# Altium footprint library COOP4403_V2.PcbLib: 26 footprints (part 1 of 2)
Each footprint in its own frame and in the unit in brackets; x right, y up, seen from the top. Pads: shape width x height; smd on the part's side, far side on the other; paste and mask are expansions set on the pad; w line width, h text height; cw(c..) or ccw(c..) is an arc to the next point about the centre after c.
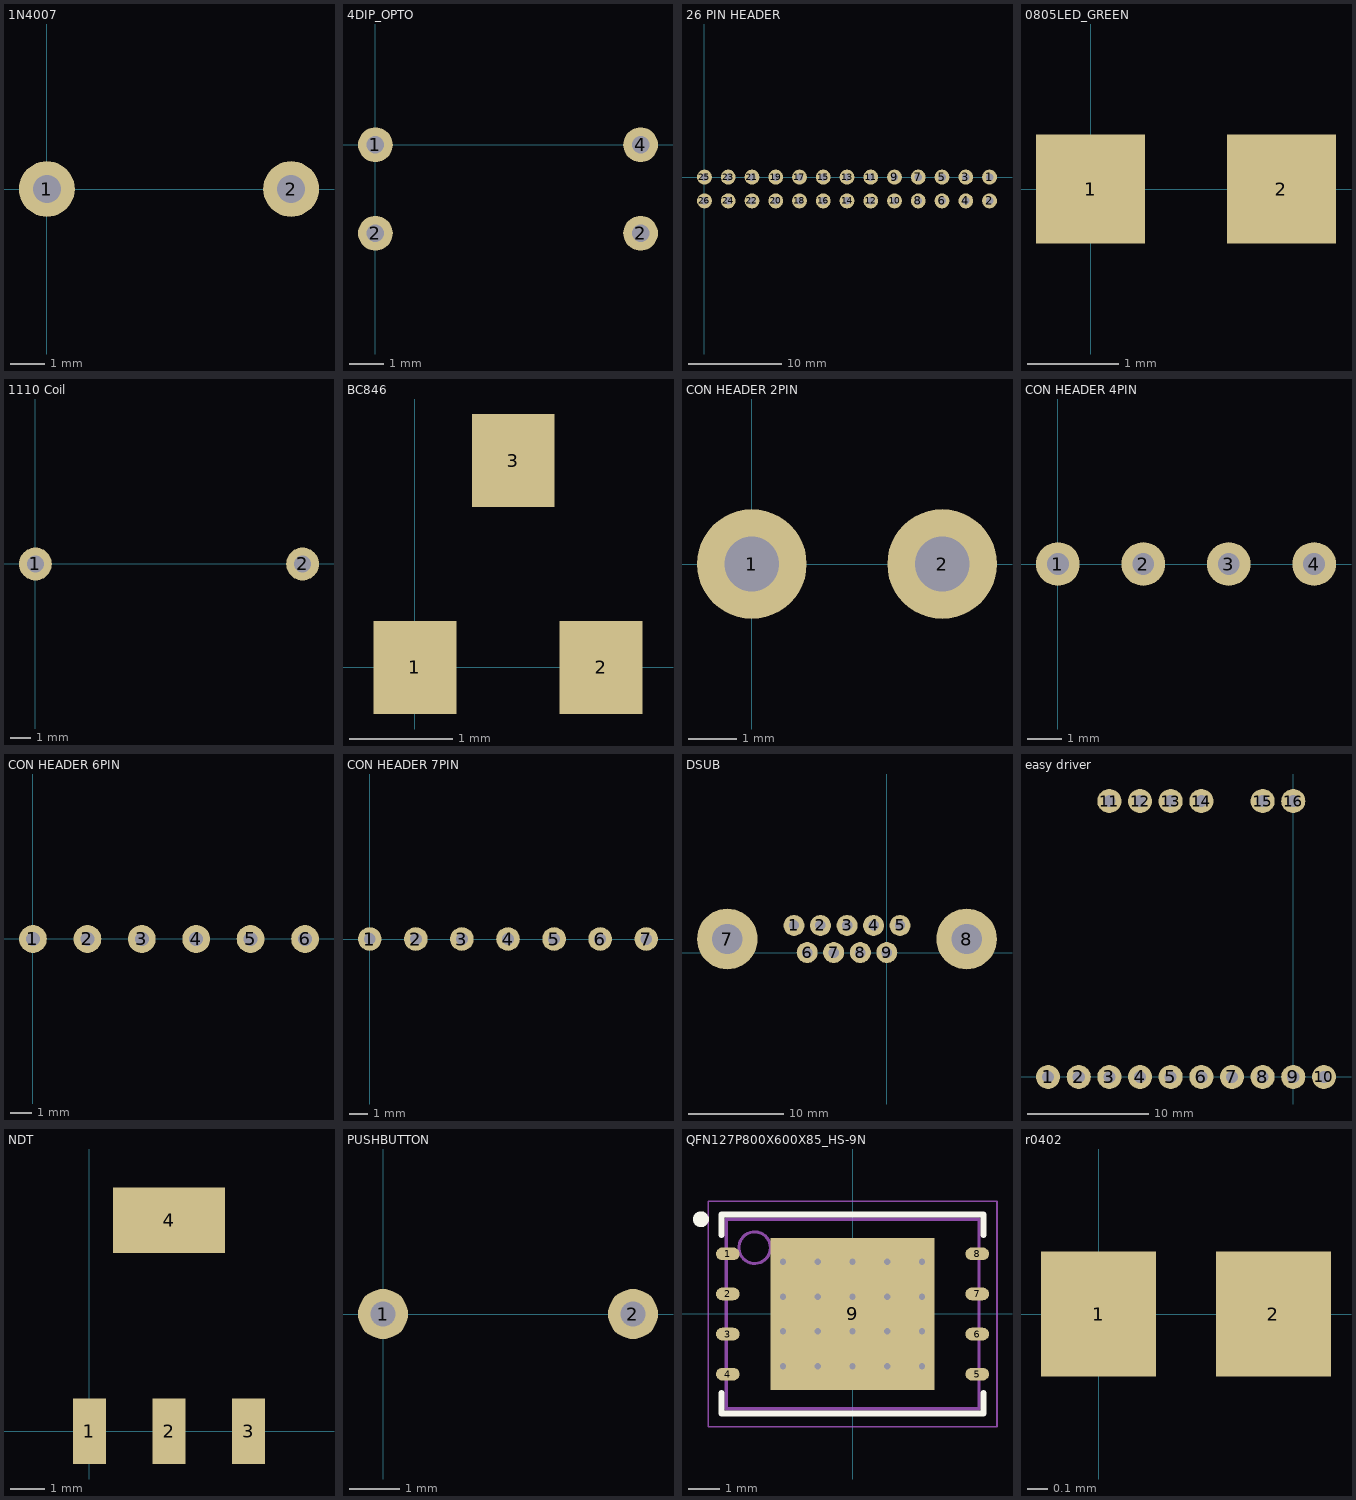
[diagram p0: the footprints below, top view; thin cyan lines are the x and y axes]

## 1N4007 [mm]
pads (2):
  round 1.6 hole 0.8: 1(0,0) 2(7,0)
3D body "User Library-1N4007 x7mm.STEP": height 3.31, standoff -1.9, extent -0.42,-1.31 7.38,1.31

## 4DIP_OPTO [mm]
pads (4):
  round 1 hole 0.5: 1(0,0) 2(0,-2.54) 2(7.62,-2.54) 4(7.62,0)
3D body "User Library-DIP4-7_62-2_54.STEP": height 4.3, standoff -2.7, extent -0.105,-3.565 7.775,1.025

## 26 PIN HEADER [mm]
pads (26):
  round 1.6 hole 0.8: 1(30.48,0) 2(30.48,-2.54) 3(27.94,0) 4(27.94,-2.54) 5(25.4,0) 6(25.4,-2.54) 7(22.86,0) 8(22.86,-2.54) 9(20.32,0) 10(20.32,-2.54) 11(17.78,0) 12(17.78,-2.54) 13(15.24,0) 14(15.24,-2.54) 15(12.7,0) 16(12.7,-2.54) 17(10.16,0) 18(10.16,-2.54) 19(7.62,0) 20(7.62,-2.54) 21(5.08,0) 22(5.08,-2.54) 23(2.54,0) 24(2.54,-2.54) 25(0,0) 26(0,-2.54)
3D body "Orange Pi Zero v1_1 - Ensamblaje.STEP": height 16.37, standoff -1.78, extent -11.867,-44.799 39.96,1.245

## 0805LED_GREEN [mm]
pads (2):
  rect 1.2x1.2 smd: 1(0,0) 2(2.1,0)
3D body "alsrobot-LED0805(R).STEP": height 1.1, standoff 0, extent 0.031,-0.6 2.051,0.65

## 1110 Coil [mm]
pads (2):
  round 1.6 hole 0.813: 1(0,0) 2(13,0)
3D body "69661.stp": height 7, standoff 0, extent -0.124,-6.703 12.875,6.297

## BC846 [mm]
pads (3):
  rect 0.8x0.9 smd: 1(0,0) 2(1.8,0) 3(0.95,2)
3D body "SW3DPS-SOT-23-DEFAULT.STEP": height 1.05, standoff -0.05, extent -0.56,-0.183 2.44,2.317

## CON HEADER 2PIN [mm]
pads (2):
  round 2.28 hole 1.14: 1(0,0) 2(3.96,0)
3D body "User Library-B2P-VH-BK.STEP": height 2.7, standoff -11.9, extent -1.898,-3.869 5.962,4.631

## CON HEADER 4PIN [mm]
pads (4):
  round 1.28 hole 0.64: 1(0,0) 2(2.5,0) 3(5,0) 4(7.5,0)
3D body "SW3dPS-jst-b4b-xh-a-1.STEP": height 7, standoff -3.4, extent -2.39,-2.321 10.01,3.429

## CON HEADER 6PIN [mm]
pads (6):
  round 1.28 hole 0.64: 1(0,0) 2(2.5,0) 3(5,0) 4(7.5,0) 5(10,0) 6(12.5,0)
3D body "SW3dPS-jst-b6b-xh-a.STEP": height 3.4, standoff -7, extent -2.414,-3.51 14.986,2.24

## CON HEADER 7PIN [mm]
pads (7):
  round 1.28 hole 0.64: 1(0,0) 2(2.5,0) 3(5,0) 4(7.5,0) 5(10,0) 6(12.5,0) 7(15,0)
3D body "User Library-B7B-XH-A.step": height 2.4, standoff -8, extent -2.45,-3.4 17.45,2.35

## DSUB [mm]
pads (11):
  round 2.2 hole 1.09: 1(-9.719,2.84) 2(-6.949,2.84) 3(-4.155,2.84) 4(-1.385,2.84) 5(1.385,2.84) 6(-8.334,0) 7(-5.564,0) 8(-2.77,0) 9(0,0)
  round 6.36 hole 3.18: 7(-16.699,1.42) 8(8.365,1.42)
3D body "SW3dPS-Connector, D-Sub, 9 pin, RA, Receptacle.STEP": height 12.55, standoff -3.99, extent -19.38,-14.351 11.506,3.988

## easy driver [mm]
pads (16):
  round 2 hole 1: 1(-20.32,0) 2(-17.78,0) 3(-15.24,0) 4(-12.7,0) 5(-10.16,0) 6(-7.62,0) 7(-5.08,0) 8(-2.54,0) 9(0,0) 10(2.54,0) 11(-15.24,22.86) 12(-12.7,22.86) 13(-10.16,22.86) 14(-7.62,22.86) 15(-2.54,22.86) 16(0,22.86)

## NDT [mm]
pads (4):
  rect 0.95x1.9 smd: 1(0,0) 2(2.3,0) 3(4.6,0)
  rect 3.25x1.9 smd: 4(2.3,6.1)

## PUSHBUTTON [mm]
pads (2):
  round 1 hole 0.5: 1(0,0) 2(5,0)
3D body "b3f-6000.stp": height 4.3, standoff -14, extent -0.46,-3 5.54,3.2

## QFN127P800X600X85_HS-9N [mm] "QFN, 8-Leads, Body 8.00x6.00mm, Pitch 1.27mm, Thermal Pad 5.20x4.80mm, IPC Medium Density"
height 0.85
pads (9):
  oval 0.75x0.4 smd: 1(-3.95,1.905) 2(-3.95,0.635) 3(-3.95,-0.635) 4(-3.95,-1.905) 5(3.95,-1.905) 6(3.95,-0.635) 7(3.95,0.635) 8(3.95,1.905)
  rect 5.2x4.8 smd: 9(0,0)
via 2.2,-1.65 diameter 0.5 hole 0.2
via 1.1,-1.65 diameter 0.5 hole 0.2
via 0,-1.65 diameter 0.5 hole 0.2
via -1.1,-1.65 diameter 0.5 hole 0.2
via -2.2,-1.65 diameter 0.5 hole 0.2
via 2.2,-0.55 diameter 0.5 hole 0.2
via 1.1,-0.55 diameter 0.5 hole 0.2
via 0,-0.55 diameter 0.5 hole 0.2
via -1.1,-0.55 diameter 0.5 hole 0.2
via -2.2,-0.55 diameter 0.5 hole 0.2
via 2.2,0.55 diameter 0.5 hole 0.2
via 1.1,0.55 diameter 0.5 hole 0.2
via 0,0.55 diameter 0.5 hole 0.2
via -1.1,0.55 diameter 0.5 hole 0.2
via -2.2,0.55 diameter 0.5 hole 0.2
via 2.2,1.65 diameter 0.5 hole 0.2
via 0,1.65 diameter 0.5 hole 0.2
via -1.1,1.65 diameter 0.5 hole 0.2
via -2.2,1.65 diameter 0.5 hole 0.2
via 1.1,1.65 diameter 0.5 hole 0.2
Top Overlay:
  circle w0.25: c-4.8,3 r0.125
  lines w0.2: -4.15,-2.505 -4.15,-3.15 0.035,-3.15 ; -4.15,2.505 -4.15,3.15 0.035,3.15 ; -0.035,-3.15 4.15,-3.15 4.15,-2.505 ; -0.035,3.15 4.15,3.15 4.15,2.505
Mechanical 13:
  circle w0.1: c-3.1,2.1 r0.5
  lines w0.1: -4,-3 4,-3 4,3 -4,3 -4,-3
Mechanical 15:
  lines w0.05: -4.575,-3.575 4.575,-3.575 4.575,3.575 -4.575,3.575 -4.575,-3.575
  lines w0.1: -0.5,0 0.5,0 ; 0,-0.5 0,0.5
3D body: height 0.85, standoff 0.05, extent -4,-3 4,3

## r0402 [mm]
pads (2):
  rect 0.55x0.6 smd: 1(0,0) 2(0.838,0)
3D body "User Library-RES_1005-0402.STEP": height 0.41, standoff 0, extent -0.168,-0.249 0.982,0.3